# Altium schematic symbol library TI Power Management Shunt Voltage Reference.SchLib: 1526 symbols (part 12 of 18) (continued)
## TL1431CDR
designator U?
Precision Adjustable (Programmable) Shunt Reference, 23 ppm / degC, 100 mA, 0 to 70 degC, 8-pin SOIC (D), Green (RoHS & no Sb/Br); Manufacturer: Texas Instruments; PartNumber: TL1431CDR; Initial Accuracy @ 25/deg C(%): 0.4; Iout/Iz(Max)(mA): 100; Min Iz for Regulation(uA): 1000; Rating: Catalog; SubFamily: Shunt Voltage Reference; Temp Coeff(Max)(ppm/ degree C): 114; Temp Coeff(Typ)(ppm/ degree C): 23; VO Adj(Max)(V): 36; VO Adj(Min)(V): 2.5; DatasheetVersion: SLVS062M; PackageVersion: 4040047-3/M; PackageReference: D8; PackageDescription: 8-Pin Plastic Small Outline, Body 4.9 x 3.9 mm, Pitch 1.27 mm; Supplier 1: Digi-Key; Supplier Part Number 1: 296-10129-2-ND; Supplier 2: Digi-Key; Supplier Part Number 2: 296-10129-1-ND; Supplier 3: Digi-Key; Supplier Part Number 3: 296-10129-6-ND; Supplier 4: Newark; Supplier Part Number 4: 76C9139; Supplier 5: Mouser; Supplier Part Number 5: 595-TL1431CDR; Eco-Plan: Green (RoHS & no Sb/Br); Mounting Technology: Surface Mount; Code_JEDEC: MS-012; ComponentLink1Description: Manufacturer URL; ComponentLink1URL: http://www.ti.com/; ComponentLink2Description: Datasheet; ComponentLink2URL: http://www.ti.com/general/docs/lit/getliterature.tsp?genericPartNumber=TL1431&fileType=pdf; ComponentLink3Description: Package Specification; ComponentLink3URL: http://www.ti.com/litv/pdf/msoi002j
footprint TI-D8_N (SOIC, 8-Leads, Body 4.9x3.9mm, Pitch 1.27mm, IPC Medium Density)
part A pins: 1 CATHODE, 2 ANODE, 3 ANODE, 6 ANODE, 7 ANODE, 8 REF (in)
part B pins: 4 NC, 5 NC

## TL1431CDRE4
designator U?
Precision Adjustable (Programmable) Shunt Reference, 23 ppm / degC, 100 mA, 0 to 70 degC, 8-pin SOIC (D), Green (RoHS & no Sb/Br); Manufacturer: Texas Instruments; PartNumber: TL1431CDRE4; Initial Accuracy @ 25/deg C(%): 0.4; Iout/Iz(Max)(mA): 100; Min Iz for Regulation(uA): 1000; Rating: Catalog; SubFamily: Shunt Voltage Reference; Temp Coeff(Max)(ppm/ degree C): 114; Temp Coeff(Typ)(ppm/ degree C): 23; VO Adj(Max)(V): 36; VO Adj(Min)(V): 2.5; DatasheetVersion: SLVS062M; PackageVersion: 4040047-3/M; PackageReference: D8; PackageDescription: 8-Pin Plastic Small Outline, Body 4.9 x 3.9 mm, Pitch 1.27 mm; Supplier 1: Digi-Key; Supplier Part Number 1: TL1431CDRE4-ND; Supplier 2: Mouser; Supplier Part Number 2: 595-TL1431CDRE4; Eco-Plan: Green (RoHS & no Sb/Br); Mounting Technology: Surface Mount; Code_JEDEC: MS-012; ComponentLink1Description: Manufacturer URL; ComponentLink1URL: http://www.ti.com/; ComponentLink2Description: Datasheet; ComponentLink2URL: http://www.ti.com/general/docs/lit/getliterature.tsp?genericPartNumber=TL1431&fileType=pdf; ComponentLink3Description: Package Specification; ComponentLink3URL: http://www.ti.com/litv/pdf/msoi002j
footprint TI-D8_N (SOIC, 8-Leads, Body 4.9x3.9mm, Pitch 1.27mm, IPC Medium Density)
part A pins: 1 CATHODE, 2 ANODE, 3 ANODE, 6 ANODE, 7 ANODE, 8 REF (in)
part B pins: 4 NC, 5 NC

## TL1431CDRG4
designator U?
Precision Adjustable (Programmable) Shunt Reference, 23 ppm / degC, 100 mA, 0 to 70 degC, 8-pin SOIC (D), Green (RoHS & no Sb/Br); Manufacturer: Texas Instruments; PartNumber: TL1431CDRG4; Initial Accuracy @ 25/deg C(%): 0.4; Iout/Iz(Max)(mA): 100; Min Iz for Regulation(uA): 1000; Rating: Catalog; SubFamily: Shunt Voltage Reference; Temp Coeff(Max)(ppm/ degree C): 114; Temp Coeff(Typ)(ppm/ degree C): 23; VO Adj(Max)(V): 36; VO Adj(Min)(V): 2.5; DatasheetVersion: SLVS062M; PackageVersion: 4040047-3/M; PackageReference: D8; PackageDescription: 8-Pin Plastic Small Outline, Body 4.9 x 3.9 mm, Pitch 1.27 mm; Supplier 1: Digi-Key; Supplier Part Number 1: TL1431CDRG4-ND; Supplier 2: Mouser; Supplier Part Number 2: 595-TL1431CDRG4; Eco-Plan: Green (RoHS & no Sb/Br); Mounting Technology: Surface Mount; Code_JEDEC: MS-012; ComponentLink1Description: Manufacturer URL; ComponentLink1URL: http://www.ti.com/; ComponentLink2Description: Datasheet; ComponentLink2URL: http://www.ti.com/general/docs/lit/getliterature.tsp?genericPartNumber=TL1431&fileType=pdf; ComponentLink3Description: Package Specification; ComponentLink3URL: http://www.ti.com/litv/pdf/msoi002j
footprint TI-D8_N (SOIC, 8-Leads, Body 4.9x3.9mm, Pitch 1.27mm, IPC Medium Density)
part A pins: 1 CATHODE, 2 ANODE, 3 ANODE, 6 ANODE, 7 ANODE, 8 REF (in)
part B pins: 4 NC, 5 NC

## TL1431CLP
designator U?
Precision Adjustable (Programmable) Shunt Reference, 23 ppm / degC, 100 mA, 0 to 70 degC, 3-pin TO-92 (LP), Pb-Free (RoHS); Manufacturer: Texas Instruments; PartNumber: TL1431CLP; Initial Accuracy @ 25/deg C(%): 0.4; Iout/Iz(Max)(mA): 100; Min Iz for Regulation(uA): 1000; Rating: Catalog; SubFamily: Shunt Voltage Reference; Temp Coeff(Max)(ppm/ degree C): 114; Temp Coeff(Typ)(ppm/ degree C): 23; VO Adj(Max)(V): 36; VO Adj(Min)(V): 2.5; DatasheetVersion: SLVS062M; PackageVersion: 4040001-2/C; PackageReference: LP3; PackageDescription: Plastic Cylindrical Package, Formed Lead Option (TO-92); Supplier 1: Digi-Key; Supplier Part Number 1: 296-10130-5-ND; Supplier 2: Newark; Supplier Part Number 2: 08F9382; Supplier 3: Mouser; Supplier Part Number 3: 595-TL1431CLP; Eco-Plan: Pb-Free (RoHS); Mounting Technology: Through Hole; Code_JEDEC: TO-226; ComponentLink1Description: Manufacturer URL; ComponentLink1URL: http://www.ti.com/; ComponentLink2Description: Datasheet; ComponentLink2URL: http://www.ti.com/general/docs/lit/getliterature.tsp?genericPartNumber=TL1431&fileType=pdf; ComponentLink3Description: Package Specification; ComponentLink3URL: http://www.ti.com/litv/pdf/msot002a
footprint TI-LP3 (TO, Flat Index; 3 In-Line, Formed Axial Leads; Body Dia. 4.8mm; Leads 0.56 x 0.41 mm (max))
pins: 1 REF (in), 2 ANODE, 3 CATHODE

## TL1431CLPE3
designator U?
Precision Adjustable (Programmable) Shunt Reference, 23 ppm / degC, 100 mA, 0 to 70 degC, 3-pin TO-92 (LP), Pb-Free (RoHS); Manufacturer: Texas Instruments; PartNumber: TL1431CLPE3; Initial Accuracy @ 25/deg C(%): 0.4; Iout/Iz(Max)(mA): 100; Min Iz for Regulation(uA): 1000; Rating: Catalog; SubFamily: Shunt Voltage Reference; Temp Coeff(Max)(ppm/ degree C): 114; Temp Coeff(Typ)(ppm/ degree C): 23; VO Adj(Max)(V): 36; VO Adj(Min)(V): 2.5; DatasheetVersion: SLVS062M; PackageVersion: 4040001-2/C; PackageReference: LP3; PackageDescription: Plastic Cylindrical Package, Formed Lead Option (TO-92); Supplier 1: Digi-Key; Supplier Part Number 1: TL1431CLPE3-ND; Supplier 2: Newark; Supplier Part Number 2: 61K1819; Supplier 3: Mouser; Supplier Part Number 3: 595-TL1431CLPE3; Eco-Plan: Pb-Free (RoHS); Mounting Technology: Through Hole; Code_JEDEC: TO-226; ComponentLink1Description: Manufacturer URL; ComponentLink1URL: http://www.ti.com/; ComponentLink2Description: Datasheet; ComponentLink2URL: http://www.ti.com/general/docs/lit/getliterature.tsp?genericPartNumber=TL1431&fileType=pdf; ComponentLink3Description: Package Specification; ComponentLink3URL: http://www.ti.com/litv/pdf/msot002a
footprint TI-LP3 (TO, Flat Index; 3 In-Line, Formed Axial Leads; Body Dia. 4.8mm; Leads 0.56 x 0.41 mm (max))
pins: 1 REF (in), 2 ANODE, 3 CATHODE

## TL1431CLPR
designator U?
Precision Adjustable (Programmable) Shunt Reference, 23 ppm / degC, 100 mA, 0 to 70 degC, 3-pin TO-92 (LP), Pb-Free (RoHS); Manufacturer: Texas Instruments; PartNumber: TL1431CLPR; Initial Accuracy @ 25/deg C(%): 0.4; Iout/Iz(Max)(mA): 100; Min Iz for Regulation(uA): 1000; Rating: Catalog; SubFamily: Shunt Voltage Reference; Temp Coeff(Max)(ppm/ degree C): 114; Temp Coeff(Typ)(ppm/ degree C): 23; VO Adj(Max)(V): 36; VO Adj(Min)(V): 2.5; DatasheetVersion: SLVS062M; PackageVersion: 4040001-2/C; PackageReference: LP3; PackageDescription: Plastic Cylindrical Package, Formed Lead Option (TO-92); Supplier 1: Digi-Key; Supplier Part Number 1: 296-10130-2-ND; Supplier 2: Digi-Key; Supplier Part Number 2: 296-10130-1-ND; Supplier 3: Digi-Key; Supplier Part Number 3: 296-10130-6-ND; Supplier 4: Newark; Supplier Part Number 4: 76C9141; Supplier 5: Mouser; Supplier Part Number 5: 595-TL1431CLPR; Eco-Plan: Pb-Free (RoHS); Mounting Technology: Through Hole; Code_JEDEC: TO-226; ComponentLink1Description: Manufacturer URL; ComponentLink1URL: http://www.ti.com/; ComponentLink2Description: Datasheet; ComponentLink2URL: http://www.ti.com/general/docs/lit/getliterature.tsp?genericPartNumber=TL1431&fileType=pdf; ComponentLink3Description: Package Specification; ComponentLink3URL: http://www.ti.com/litv/pdf/msot002a
footprint TI-LP3 (TO, Flat Index; 3 In-Line, Formed Axial Leads; Body Dia. 4.8mm; Leads 0.56 x 0.41 mm (max))
pins: 1 REF (in), 2 ANODE, 3 CATHODE

## TL1431CLPRE3
designator U?
Precision Adjustable (Programmable) Shunt Reference, 23 ppm / degC, 100 mA, 0 to 70 degC, 3-pin TO-92 (LP), Pb-Free (RoHS); Manufacturer: Texas Instruments; PartNumber: TL1431CLPRE3; Initial Accuracy @ 25/deg C(%): 0.4; Iout/Iz(Max)(mA): 100; Min Iz for Regulation(uA): 1000; Rating: Catalog; SubFamily: Shunt Voltage Reference; Temp Coeff(Max)(ppm/ degree C): 114; Temp Coeff(Typ)(ppm/ degree C): 23; VO Adj(Max)(V): 36; VO Adj(Min)(V): 2.5; DatasheetVersion: SLVS062M; PackageVersion: 4040001-2/C; PackageReference: LP3; PackageDescription: Plastic Cylindrical Package, Formed Lead Option (TO-92); Supplier 1: Digi-Key; Supplier Part Number 1: TL1431CLPRE3-ND; Supplier 2: Newark; Supplier Part Number 2: 61K1820; Supplier 3: Mouser; Supplier Part Number 3: 595-TL1431CLPRE3; Eco-Plan: Pb-Free (RoHS); Mounting Technology: Through Hole; Code_JEDEC: TO-226; ComponentLink1Description: Manufacturer URL; ComponentLink1URL: http://www.ti.com/; ComponentLink2Description: Datasheet; ComponentLink2URL: http://www.ti.com/general/docs/lit/getliterature.tsp?genericPartNumber=TL1431&fileType=pdf; ComponentLink3Description: Package Specification; ComponentLink3URL: http://www.ti.com/litv/pdf/msot002a
footprint TI-LP3 (TO, Flat Index; 3 In-Line, Formed Axial Leads; Body Dia. 4.8mm; Leads 0.56 x 0.41 mm (max))
pins: 1 REF (in), 2 ANODE, 3 CATHODE

## TL1431CPW
designator U?
Precision Adjustable (Programmable) Shunt Reference, 23 ppm / degC, 100 mA, 0 to 70 degC, 8-pin TSSOP (PW), Green (RoHS & no Sb/Br); Manufacturer: Texas Instruments; PartNumber: TL1431CPW; Iout/Iz(Max)(mA): 100; Min Iz for Regulation(uA): 1000; Rating: Catalog; SubFamily: Shunt Voltage Reference; Temp Coeff(Max)(ppm/ degree C): 114; Temp Coeff(Typ)(ppm/ degree C): 23; VO Adj(Max)(V): 36; VO Adj(Min)(V): 2.5; DatasheetVersion: SLVS062M; PackageVersion: 4040064-2/G; PackageReference: PW8; PackageDescription: 8-Pin Plastic Small Outline, Body 4.4 x 3 mm, Pitch 0.65 mm; Supplier 1: Digi-Key; Supplier Part Number 1: TL1431CPW-ND; Supplier 2: Mouser; Supplier Part Number 2: 595-TL1431CPW; Eco-Plan: Green (RoHS & no Sb/Br); Mounting Technology: Surface Mount; Code_JEDEC: MO-153; ComponentLink1Description: Manufacturer URL; ComponentLink1URL: http://www.ti.com/; ComponentLink2Description: Datasheet; ComponentLink2URL: http://www.ti.com/general/docs/lit/getliterature.tsp?genericPartNumber=TL1431&fileType=pdf; ComponentLink3Description: Package Specification; ComponentLink3URL: http://www.ti.com/litv/pdf/mtss001d
footprint TI-PW8_N (SOP, 8-Leads, Body 4.4x3mm, Pitch 0.65mm, IPC Medium Density)
part A pins: 1 CATHODE, 6 ANODE, 8 REF (in)
part B pins: 2 NC "No internal connection", 3 NC "No internal connection", 4 NC "No internal connection", 5 NC "No internal connection", 7 NC "No internal connection"

## TL1431CPWE4
designator U?
Precision Adjustable (Programmable) Shunt Reference, 23 ppm / degC, 100 mA, 0 to 70 degC, 8-pin TSSOP (PW), Green (RoHS & no Sb/Br); Manufacturer: Texas Instruments; PartNumber: TL1431CPWE4; Iout/Iz(Max)(mA): 100; Min Iz for Regulation(uA): 1000; Rating: Catalog; SubFamily: Shunt Voltage Reference; Temp Coeff(Max)(ppm/ degree C): 114; Temp Coeff(Typ)(ppm/ degree C): 23; VO Adj(Max)(V): 36; VO Adj(Min)(V): 2.5; DatasheetVersion: SLVS062M; PackageVersion: 4040064-2/G; PackageReference: PW8; PackageDescription: 8-Pin Plastic Small Outline, Body 4.4 x 3 mm, Pitch 0.65 mm; Supplier 1: Digi-Key; Supplier Part Number 1: TL1431CPWE4-ND; Supplier 2: Mouser; Supplier Part Number 2: 595-TL1431CPWE4; Eco-Plan: Green (RoHS & no Sb/Br); Mounting Technology: Surface Mount; Code_JEDEC: MO-153; ComponentLink1Description: Manufacturer URL; ComponentLink1URL: http://www.ti.com/; ComponentLink2Description: Datasheet; ComponentLink2URL: http://www.ti.com/general/docs/lit/getliterature.tsp?genericPartNumber=TL1431&fileType=pdf; ComponentLink3Description: Package Specification; ComponentLink3URL: http://www.ti.com/litv/pdf/mtss001d
footprint TI-PW8_N (SOP, 8-Leads, Body 4.4x3mm, Pitch 0.65mm, IPC Medium Density)
part A pins: 1 CATHODE, 6 ANODE, 8 REF (in)
part B pins: 2 NC "No internal connection", 3 NC "No internal connection", 4 NC "No internal connection", 5 NC "No internal connection", 7 NC "No internal connection"

## TL1431CPWG4
designator U?
Precision Adjustable (Programmable) Shunt Reference, 23 ppm / degC, 100 mA, 0 to 70 degC, 8-pin TSSOP (PW), Green (RoHS & no Sb/Br); Manufacturer: Texas Instruments; PartNumber: TL1431CPWG4; Iout/Iz(Max)(mA): 100; Min Iz for Regulation(uA): 1000; Rating: Catalog; SubFamily: Shunt Voltage Reference; Temp Coeff(Max)(ppm/ degree C): 114; Temp Coeff(Typ)(ppm/ degree C): 23; VO Adj(Max)(V): 36; VO Adj(Min)(V): 2.5; DatasheetVersion: SLVS062M; PackageVersion: 4040064-2/G; PackageReference: PW8; PackageDescription: 8-Pin Plastic Small Outline, Body 4.4 x 3 mm, Pitch 0.65 mm; Supplier 1: Digi-Key; Supplier Part Number 1: TL1431CPWG4-ND; Supplier 2: Newark; Supplier Part Number 2: 46M9105; Supplier 3: Mouser; Supplier Part Number 3: 595-TL1431CPWG4; Eco-Plan: Green (RoHS & no Sb/Br); Mounting Technology: Surface Mount; Code_JEDEC: MO-153; ComponentLink1Description: Manufacturer URL; ComponentLink1URL: http://www.ti.com/; ComponentLink2Description: Datasheet; ComponentLink2URL: http://www.ti.com/general/docs/lit/getliterature.tsp?genericPartNumber=TL1431&fileType=pdf; ComponentLink3Description: Package Specification; ComponentLink3URL: http://www.ti.com/litv/pdf/mtss001d
footprint TI-PW8_N (SOP, 8-Leads, Body 4.4x3mm, Pitch 0.65mm, IPC Medium Density)
part A pins: 1 CATHODE, 6 ANODE, 8 REF (in)
part B pins: 2 NC "No internal connection", 3 NC "No internal connection", 4 NC "No internal connection", 5 NC "No internal connection", 7 NC "No internal connection"

## TL1431CPWR
designator U?
Precision Adjustable (Programmable) Shunt Reference, 23 ppm / degC, 100 mA, 0 to 70 degC, 8-pin TSSOP (PW), Green (RoHS & no Sb/Br); Manufacturer: Texas Instruments; PartNumber: TL1431CPWR; Iout/Iz(Max)(mA): 100; Min Iz for Regulation(uA): 1000; Rating: Catalog; SubFamily: Shunt Voltage Reference; Temp Coeff(Max)(ppm/ degree C): 114; Temp Coeff(Typ)(ppm/ degree C): 23; VO Adj(Max)(V): 36; VO Adj(Min)(V): 2.5; DatasheetVersion: SLVS062M; PackageVersion: 4040064-2/G; PackageReference: PW8; PackageDescription: 8-Pin Plastic Small Outline, Body 4.4 x 3 mm, Pitch 0.65 mm; Supplier 1: Digi-Key; Supplier Part Number 1: 296-12607-2-ND; Supplier 2: Digi-Key; Supplier Part Number 2: 296-12607-1-ND; Supplier 3: Digi-Key; Supplier Part Number 3: 296-12607-6-ND; Supplier 4: Mouser; Supplier Part Number 4: 595-TL1431CPWR; Eco-Plan: Green (RoHS & no Sb/Br); Mounting Technology: Surface Mount; Code_JEDEC: MO-153; ComponentLink1Description: Manufacturer URL; ComponentLink1URL: http://www.ti.com/; ComponentLink2Description: Datasheet; ComponentLink2URL: http://www.ti.com/general/docs/lit/getliterature.tsp?genericPartNumber=TL1431&fileType=pdf; ComponentLink3Description: Package Specification; ComponentLink3URL: http://www.ti.com/litv/pdf/mtss001d
footprint TI-PW8_N (SOP, 8-Leads, Body 4.4x3mm, Pitch 0.65mm, IPC Medium Density)
part A pins: 1 CATHODE, 6 ANODE, 8 REF (in)
part B pins: 2 NC "No internal connection", 3 NC "No internal connection", 4 NC "No internal connection", 5 NC "No internal connection", 7 NC "No internal connection"

## TL1431CPWRE4
designator U?
Precision Adjustable (Programmable) Shunt Reference, 23 ppm / degC, 100 mA, 0 to 70 degC, 8-pin TSSOP (PW), Green (RoHS & no Sb/Br); Manufacturer: Texas Instruments; PartNumber: TL1431CPWRE4; Iout/Iz(Max)(mA): 100; Min Iz for Regulation(uA): 1000; Rating: Catalog; SubFamily: Shunt Voltage Reference; Temp Coeff(Max)(ppm/ degree C): 114; Temp Coeff(Typ)(ppm/ degree C): 23; VO Adj(Max)(V): 36; VO Adj(Min)(V): 2.5; DatasheetVersion: SLVS062M; PackageVersion: 4040064-2/G; PackageReference: PW8; PackageDescription: 8-Pin Plastic Small Outline, Body 4.4 x 3 mm, Pitch 0.65 mm; Supplier 1: Digi-Key; Supplier Part Number 1: TL1431CPWRE4-ND; Supplier 2: Newark; Supplier Part Number 2: 33K7444; Supplier 3: Mouser; Supplier Part Number 3: 595-TL1431CPWRE4; Eco-Plan: Green (RoHS & no Sb/Br); Mounting Technology: Surface Mount; Code_JEDEC: MO-153; ComponentLink1Description: Manufacturer URL; ComponentLink1URL: http://www.ti.com/; ComponentLink2Description: Datasheet; ComponentLink2URL: http://www.ti.com/general/docs/lit/getliterature.tsp?genericPartNumber=TL1431&fileType=pdf; ComponentLink3Description: Package Specification; ComponentLink3URL: http://www.ti.com/litv/pdf/mtss001d
footprint TI-PW8_N (SOP, 8-Leads, Body 4.4x3mm, Pitch 0.65mm, IPC Medium Density)
part A pins: 1 CATHODE, 6 ANODE, 8 REF (in)
part B pins: 2 NC "No internal connection", 3 NC "No internal connection", 4 NC "No internal connection", 5 NC "No internal connection", 7 NC "No internal connection"

## TL1431CPWRG4
designator U?
Precision Adjustable (Programmable) Shunt Reference, 23 ppm / degC, 100 mA, 0 to 70 degC, 8-pin TSSOP (PW), Green (RoHS & no Sb/Br); Manufacturer: Texas Instruments; PartNumber: TL1431CPWRG4; Iout/Iz(Max)(mA): 100; Min Iz for Regulation(uA): 1000; Rating: Catalog; SubFamily: Shunt Voltage Reference; Temp Coeff(Max)(ppm/ degree C): 114; Temp Coeff(Typ)(ppm/ degree C): 23; VO Adj(Max)(V): 36; VO Adj(Min)(V): 2.5; DatasheetVersion: SLVS062M; PackageVersion: 4040064-2/G; PackageReference: PW8; PackageDescription: 8-Pin Plastic Small Outline, Body 4.4 x 3 mm, Pitch 0.65 mm; Supplier 1: Digi-Key; Supplier Part Number 1: TL1431CPWRG4-ND; Supplier 2: Newark; Supplier Part Number 2: 46M9106; Supplier 3: Mouser; Supplier Part Number 3: 595-TL1431CPWRG4; Eco-Plan: Green (RoHS & no Sb/Br); Mounting Technology: Surface Mount; Code_JEDEC: MO-153; ComponentLink1Description: Manufacturer URL; ComponentLink1URL: http://www.ti.com/; ComponentLink2Description: Datasheet; ComponentLink2URL: http://www.ti.com/general/docs/lit/getliterature.tsp?genericPartNumber=TL1431&fileType=pdf; ComponentLink3Description: Package Specification; ComponentLink3URL: http://www.ti.com/litv/pdf/mtss001d
footprint TI-PW8_N (SOP, 8-Leads, Body 4.4x3mm, Pitch 0.65mm, IPC Medium Density)
part A pins: 1 CATHODE, 6 ANODE, 8 REF (in)
part B pins: 2 NC "No internal connection", 3 NC "No internal connection", 4 NC "No internal connection", 5 NC "No internal connection", 7 NC "No internal connection"

## TL1431MDREP
designator U?
Enhanced Product Precision Adjustable (Programmable) Shunt Reference, 100 mA, -55 to 125 degC, 8-pin SOIC (D), Green (RoHS & no Sb/Br); Manufacturer: Texas Instruments; PartNumber: TL1431MDREP; Initial Accuracy @ 25/deg C(%): 0.4; Iout/Iz(Max)(mA): 100; Min Iz for Regulation(uA): 1000; Rating: HiRel Enhanced Product; SubFamily: Shunt Voltage Reference; VO Adj(Max)(V): 36; VO Adj(Min)(V): 2.5; DatasheetVersion: SLVS529C; PackageVersion: 4040047-3/M; PackageReference: D8; PackageDescription: 8-Pin Plastic Small Outline, Body 4.9 x 3.9 mm, Pitch 1.27 mm; Supplier 1: Digi-Key; Supplier Part Number 1: 296-21550-2-ND; Supplier 2: Digi-Key; Supplier Part Number 2: 296-21550-1-ND; Supplier 3: Digi-Key; Supplier Part Number 3: 296-21550-6-ND; Supplier 4: Newark; Supplier Part Number 4: 46M0970; Supplier 5: Mouser; Supplier Part Number 5: 595-TL1431MDREP; Eco-Plan: Green (RoHS & no Sb/Br); Mounting Technology: Surface Mount; Code_JEDEC: MS-012; ComponentLink1Description: Manufacturer URL; ComponentLink1URL: http://www.ti.com/; ComponentLink2Description: Datasheet; ComponentLink2URL: http://www.ti.com/general/docs/lit/getliterature.tsp?genericPartNumber=TL1431-EP&fileType=pdf; ComponentLink3Description: Package Specification; ComponentLink3URL: http://www.ti.com/litv/pdf/msoi002j; ComponentLink4Description: URL Link1; ComponentLink4URL: Samples URL:http://www.ti.com/product/tl1431-ep
footprint TI-D8_N (SOIC, 8-Leads, Body 4.9x3.9mm, Pitch 1.27mm, IPC Medium Density)
part A pins: 1 CATHODE, 2 ANODE, 3 ANODE, 6 ANODE, 7 ANODE, 8 REF (in)
part B pins: 4 NC, 5 NC

## TL1431MDREPG4
designator U?
Enhanced Product Precision Adjustable (Programmable) Shunt Reference, 100 mA, -55 to 125 degC, 8-pin SOIC (D), Green (RoHS & no Sb/Br); Manufacturer: Texas Instruments; PartNumber: TL1431MDREPG4; Initial Accuracy @ 25/deg C(%): 0.4; Iout/Iz(Max)(mA): 100; Min Iz for Regulation(uA): 1000; Rating: HiRel Enhanced Product; SubFamily: Shunt Voltage Reference; VO Adj(Max)(V): 36; VO Adj(Min)(V): 2.5; DatasheetVersion: SLVS529C; PackageVersion: 4040047-3/M; PackageReference: D8; PackageDescription: 8-Pin Plastic Small Outline, Body 4.9 x 3.9 mm, Pitch 1.27 mm; Supplier 1: Digi-Key; Supplier Part Number 1: TL1431MDREPG4-ND; Supplier 2: Newark; Supplier Part Number 2: 25P9050; Supplier 3: Mouser; Supplier Part Number 3: 595-TL1431MDREPG4; Eco-Plan: Green (RoHS & no Sb/Br); Mounting Technology: Surface Mount; Code_JEDEC: MS-012; ComponentLink1Description: Manufacturer URL; ComponentLink1URL: http://www.ti.com/; ComponentLink2Description: Datasheet; ComponentLink2URL: http://www.ti.com/general/docs/lit/getliterature.tsp?genericPartNumber=TL1431-EP&fileType=pdf; ComponentLink3Description: Package Specification; ComponentLink3URL: http://www.ti.com/litv/pdf/msoi002j
footprint TI-D8_N (SOIC, 8-Leads, Body 4.9x3.9mm, Pitch 1.27mm, IPC Medium Density)
part A pins: 1 CATHODE, 2 ANODE, 3 ANODE, 6 ANODE, 7 ANODE, 8 REF (in)
part B pins: 4 NC, 5 NC

## TL1431MFK
designator U?
Precision Adjustable (Programmable) Shunt Reference, 100 mA, -55 to 125 degC, 20-pin LCCC (FK); Manufacturer: Texas Instruments; PartNumber: TL1431MFK; Eco-Plan: TBD; Initial Accuracy @ 25/deg C(%): 0.4; Iout/Iz(Max)(mA): 100; Min Iz for Regulation(uA): 1000; Rating: Military; SubFamily: Shunt Voltage Reference; VO Adj(Max)(V): 36; VO Adj(Min)(V): 2.5; DatasheetVersion: SLVS062M; PackageVersion: 4040140/D; PackageReference: FK20; PackageDescription: 20-Pin Ceramic, Metal Chip Carrier, Body 8.89 x 8.89 mm, Pitch 1.27 mm; Mounting Technology: Surface Mount; Code_JEDEC: MS-004; ComponentLink1Description: Manufacturer URL; ComponentLink1URL: http://www.ti.com/; ComponentLink2Description: Datasheet; ComponentLink2URL: http://www.ti.com/general/docs/lit/getliterature.tsp?genericPartNumber=TL1431M&fileType=pdf; ComponentLink3Description: Package Specification; ComponentLink3URL: http://www.ti.com/litv/pdf/mlcc006d; ComponentLink4Description: URL Link1; ComponentLink4URL: Samples URL:http://www.ti.com/product/tl1431m
footprint TI-FK20_N (Leadless Chip Carrier, 20-Leads, Body 8.9x8.9mm, Pitch 1.27mm, IPC Medium Density)
part A pins: 2 CATHODE, 15 ANODE, 20 REF (in)
part B pins: 1 NC, 3 NC, 4 NC, 5 NC, 6 NC, 7 NC, 8 NC, 9 NC, 10 NC, 11 NC, 12 NC, 13 NC, 14 NC, 16 NC, 17 NC, 18 NC, 19 NC

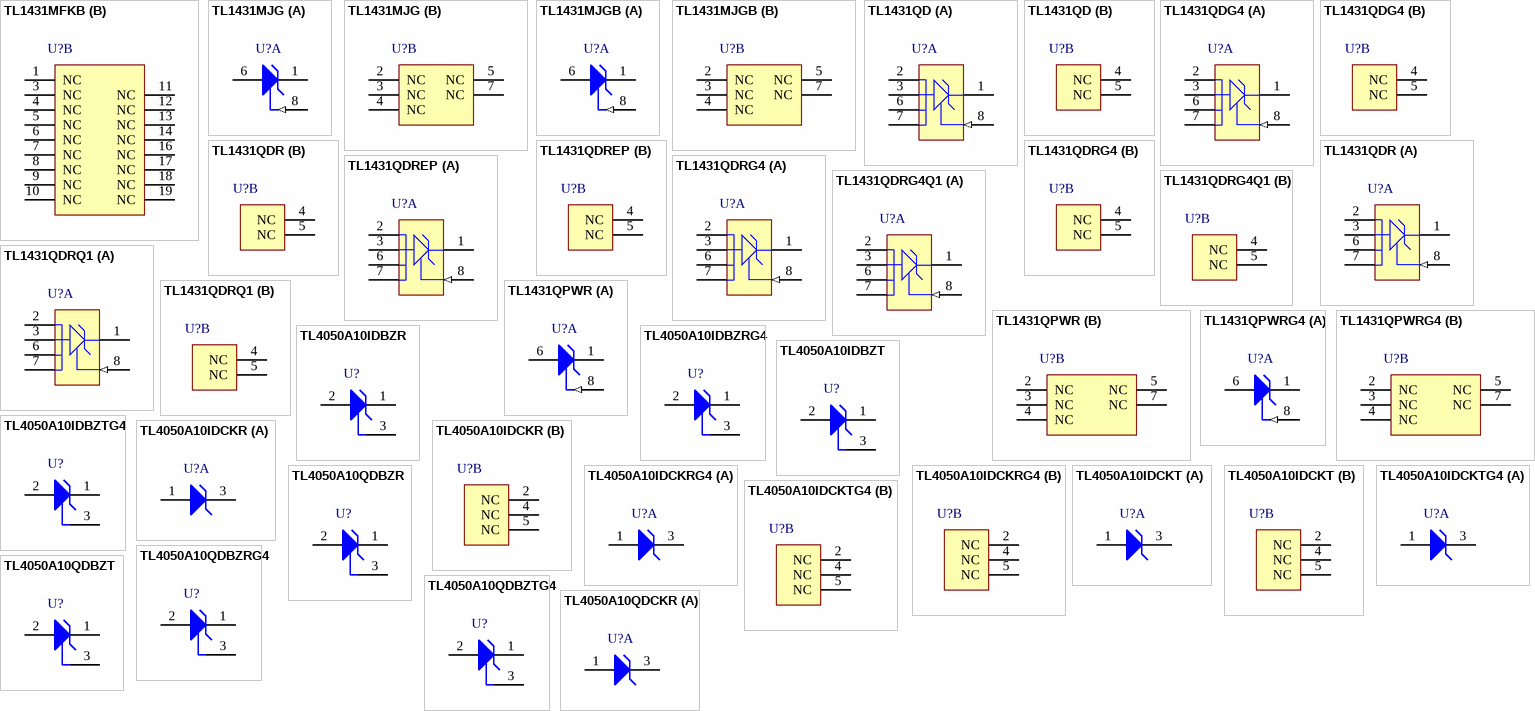
[diagram p36: symbols TL1431MFKB to TL4050A10QDCKR]

## TL1431MFKB
designator U?
Precision Adjustable (Programmable) Shunt Reference, 100 mA, -55 to 125 degC, 20-pin LCCC (FK); Manufacturer: Texas Instruments; PartNumber: TL1431MFKB; Eco-Plan: TBD; Initial Accuracy @ 25/deg C(%): 0.4; Iout/Iz(Max)(mA): 100; Min Iz for Regulation(uA): 1000; Rating: Military; SubFamily: Shunt Voltage Reference; VO Adj(Max)(V): 36; VO Adj(Min)(V): 2.5; DatasheetVersion: SLVS062M; PackageVersion: 4040140/D; PackageReference: FK20; PackageDescription: 20-Pin Ceramic, Metal Chip Carrier, Body 8.89 x 8.89 mm, Pitch 1.27 mm; Mounting Technology: Surface Mount; Code_JEDEC: MS-004; ComponentLink1Description: Manufacturer URL; ComponentLink1URL: http://www.ti.com/; ComponentLink2Description: Datasheet; ComponentLink2URL: http://www.ti.com/general/docs/lit/getliterature.tsp?genericPartNumber=TL1431M&fileType=pdf; ComponentLink3Description: Package Specification; ComponentLink3URL: http://www.ti.com/litv/pdf/mlcc006d; ComponentLink4Description: URL Link1; ComponentLink4URL: Samples URL:http://www.ti.com/product/tl1431m
footprint TI-FK20_N (Leadless Chip Carrier, 20-Leads, Body 8.9x8.9mm, Pitch 1.27mm, IPC Medium Density)
part A pins: 2 CATHODE, 15 ANODE, 20 REF (in)
part B pins: 1 NC, 3 NC, 4 NC, 5 NC, 6 NC, 7 NC, 8 NC, 9 NC, 10 NC, 11 NC, 12 NC, 13 NC, 14 NC, 16 NC, 17 NC, 18 NC, 19 NC

## TL1431MJG
designator U?
Precision Adjustable (Programmable) Shunt Reference, 100 mA, -55 to 125 degC, 8-pin CDIP (JG); Manufacturer: Texas Instruments; PartNumber: TL1431MJG; Eco-Plan: TBD; Initial Accuracy @ 25/deg C(%): 0.4; Iout/Iz(Max)(mA): 100; Min Iz for Regulation(uA): 1000; Rating: Military; SubFamily: Shunt Voltage Reference; VO Adj(Max)(V): 36; VO Adj(Min)(V): 2.5; DatasheetVersion: SLVS062M; PackageReference: JG8; PackageDescription: 8-Pin Ceramic, Glass In-Line, Body 9.58 x 6.665 mm, Pitch 2.54 mm; Mounting Technology: Through Hole; ComponentLink1Description: Manufacturer URL; ComponentLink1URL: http://www.ti.com/; ComponentLink2Description: Datasheet; ComponentLink2URL: http://www.ti.com/general/docs/lit/getliterature.tsp?genericPartNumber=TL1431M&fileType=pdf; ComponentLink3Description: Package Specification; ComponentLink3URL: http://www.ti.com/litv/pdf/mcer001a; ComponentLink4Description: URL Link1; ComponentLink4URL: Samples URL:http://www.ti.com/product/tl1431m
footprint TI-JG8 (DIP, 8-Leads, Body 10.15x7.1mm, Pitch 2.54mm)
part A pins: 1 CATHODE, 6 ANODE, 8 REF (in)
part B pins: 2 NC, 3 NC, 4 NC, 5 NC, 7 NC

## TL1431MJGB
designator U?
Precision Adjustable (Programmable) Shunt Reference, 100 mA, -55 to 125 degC, 8-pin CDIP (JG); Manufacturer: Texas Instruments; PartNumber: TL1431MJGB; Eco-Plan: TBD; Initial Accuracy @ 25/deg C(%): 0.4; Iout/Iz(Max)(mA): 100; Min Iz for Regulation(uA): 1000; Rating: Military; SubFamily: Shunt Voltage Reference; VO Adj(Max)(V): 36; VO Adj(Min)(V): 2.5; DatasheetVersion: SLVS062M; PackageReference: JG8; PackageDescription: 8-Pin Ceramic, Glass In-Line, Body 9.58 x 6.665 mm, Pitch 2.54 mm; Mounting Technology: Through Hole; ComponentLink1Description: Manufacturer URL; ComponentLink1URL: http://www.ti.com/; ComponentLink2Description: Datasheet; ComponentLink2URL: http://www.ti.com/general/docs/lit/getliterature.tsp?genericPartNumber=TL1431M&fileType=pdf; ComponentLink3Description: Package Specification; ComponentLink3URL: http://www.ti.com/litv/pdf/mcer001a; ComponentLink4Description: URL Link1; ComponentLink4URL: Samples URL:http://www.ti.com/product/tl1431m
footprint TI-JG8 (DIP, 8-Leads, Body 10.15x7.1mm, Pitch 2.54mm)
part A pins: 1 CATHODE, 6 ANODE, 8 REF (in)
part B pins: 2 NC, 3 NC, 4 NC, 5 NC, 7 NC
